# Altium integrated library mylib.IntLib: 236 symbols (part 1 of 2)
Pins are listed as number, name and electrical type; pins without a type are passive.

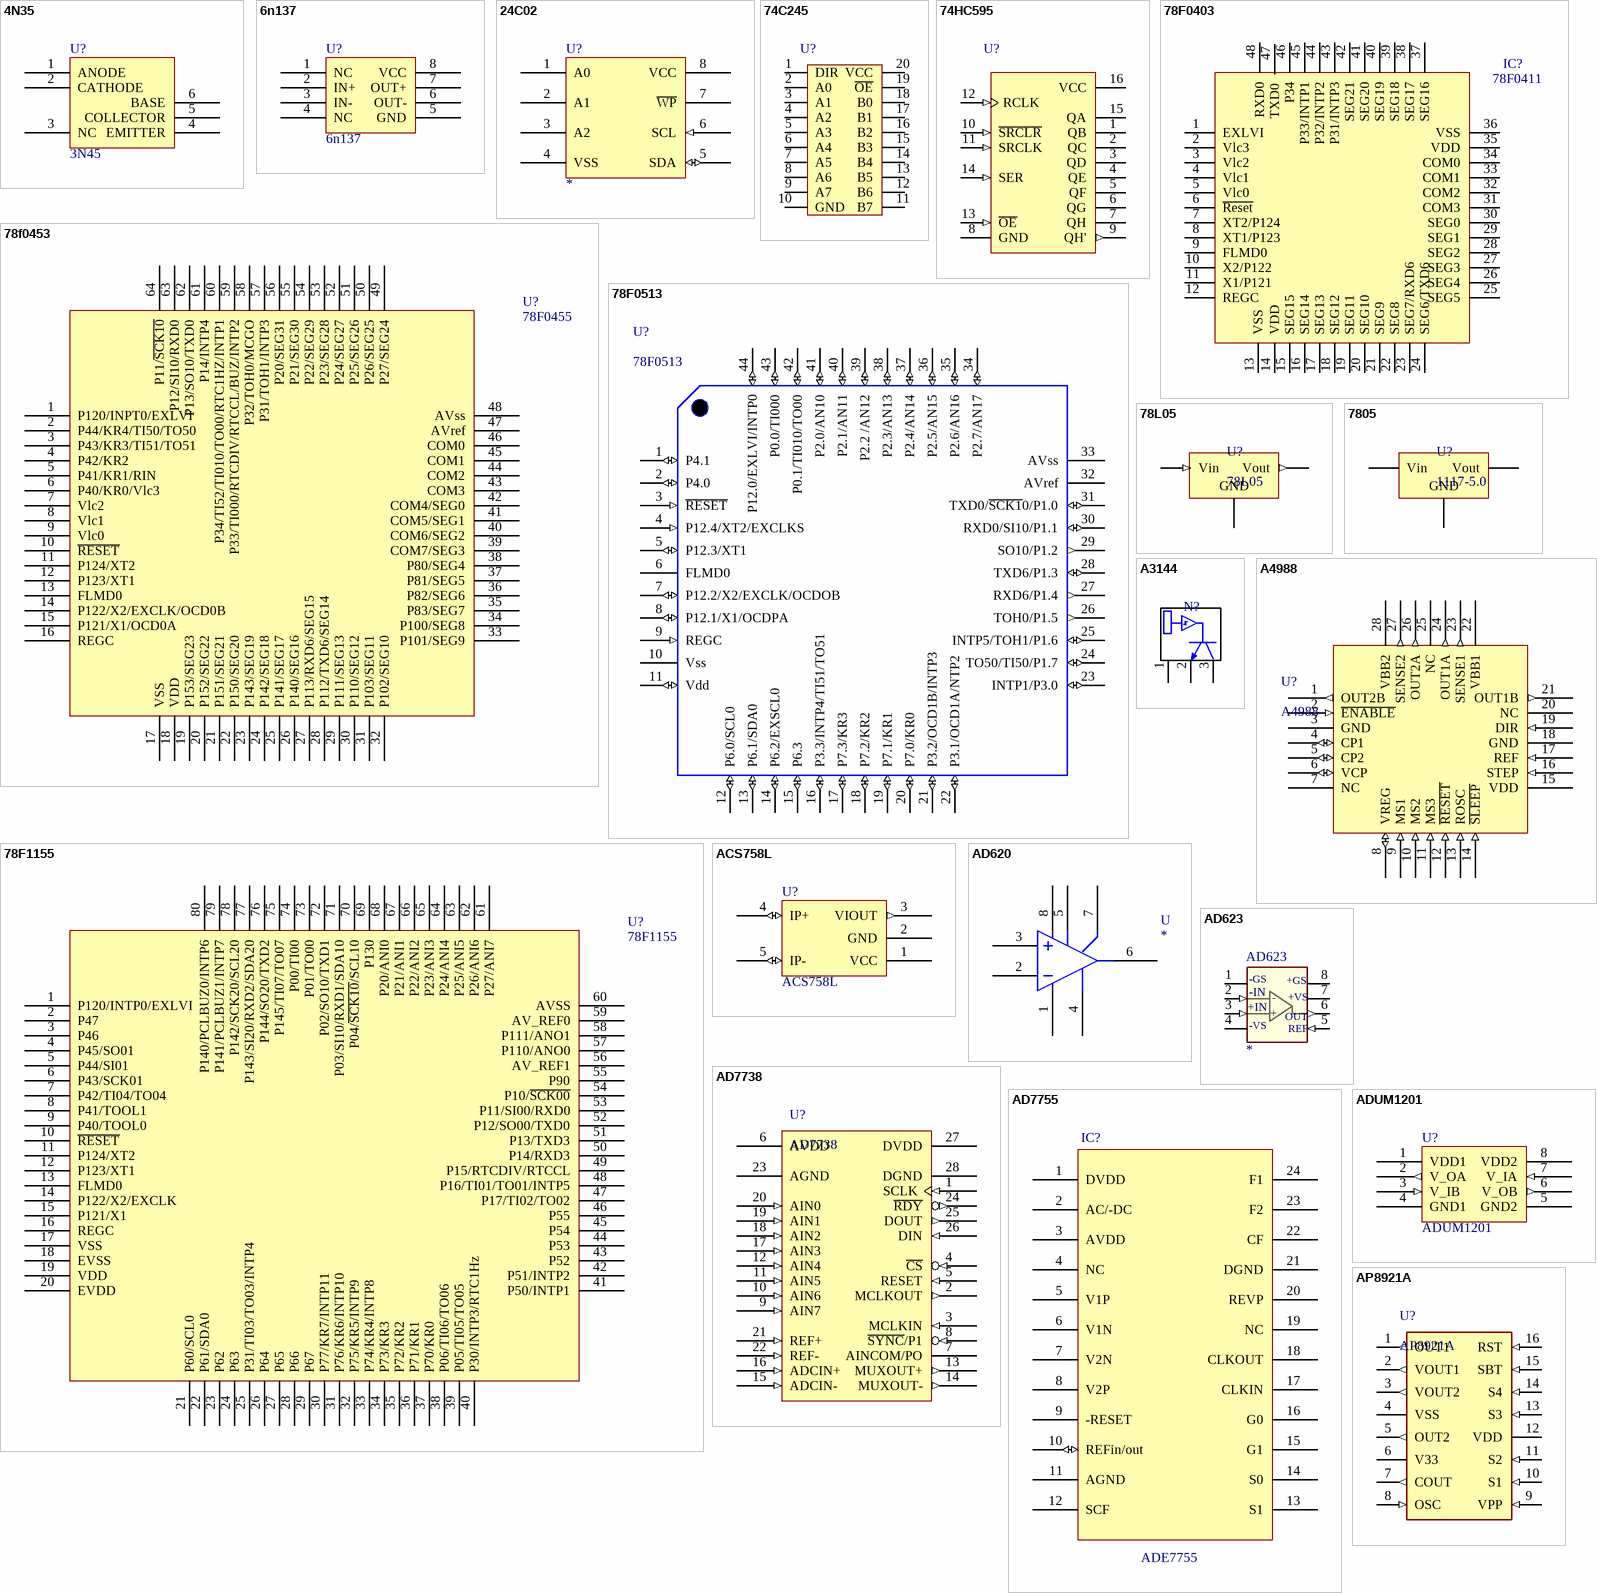
[diagram p0: symbols 4N35 to AP8921A]

## 4N35
designator U?, comment 3N45
footprint DIP6
pins: 1 ANODE, 2 CATHODE, 3 NC, 4 EMITTER, 5 COLLECTOR, 6 BASE

## 6n137
designator U?
footprint DIP8
pins: 1 NC, 2 IN+, 3 IN-, 4 NC, 5 GND (power), 6 OUT-, 7 OUT+, 8 VCC (power)

## 24C02
designator U?
pins: 1 A0, 2 A1, 3 A2, 4 VSS (power), 5 SDA (io), 6 SCL (in), 7 ~{WP}, 8 VCC (power)

## 74C245
designator U?  (value not drawn)
footprint DIP20
pins: 1 DIR, 2 A0, 3 A1, 4 A2, 5 A3, 6 A4, 7 A5, 8 A6, 9 A7, 10 GND (power), 11 B7 (power), 12 B6 (power), 13 B5 (power), 14 B4 (power), 15 B3 (power), 16 B2 (power), 17 B1 (power), 18 B0 (power), 19 ~{OE} (power), 20 VCC (power)

## 74HC595
designator U?  (value not drawn)
footprint SOJ-16
pins: 1 QB (hiz), 2 QC (hiz), 3 QD (hiz), 4 QE (hiz), 5 QF (hiz), 6 QG (hiz), 7 QH (hiz), 8 GND (power), 9 QH' (out), 10 ~{SRCLR} (in), 11 SRCLK (in), 12 RCLK (in), 13 ~{OE} (in), 14 SER (in), 15 QA (hiz), 16 VCC (power)

## 78F0403
designator IC?, comment 78F0411
footprint QUAD48
pins: 1 EXLVI, 2 Vlc3, 3 Vlc2, 4 Vlc1, 5 Vlc0, 6 ~{Reset}, 7 XT2/P124, 8 XT1/P123, 9 FLMD0, 10 X2/P122, 11 X1/P121, 12 REGC, 13 VSS, 14 VDD, 15 SEG15, 16 SEG14, 17 SEG13, 18 SEG12, 19 SEG11, 20 SEG10, 21 SEG9, 22 SEG8, 23 SEG7/RXD6, 24 SEG6/TXD6, 25 SEG5, 26 SEG4, 27 SEG3, 28 SEG2, 29 SEG1, 30 SEG0, 31 COM3, 32 COM2, 33 COM1, 34 COM0, 35 VDD, 36 VSS, 37 SEG16, 38 SEG17, 39 SEG18, 40 SEG19, 41 SEG20, 42 SEG21, 43 P31/INTP3, 44 P32/INTP2, 45 P33/INTP1, 46 P34, 47 TXD0, 48 RXD0
2 alternate drawings of the same symbol

## 78f0453
designator U?, comment 78F0455
footprint QFP12X12-64
pins: 1 P120/INPT0/EXLVI, 2 P44/KR4/TI50/TO50, 3 P43/KR3/TI51/TO51, 4 P42/KR2, 5 P41/KR1/RIN, 6 P40/KR0/Vlc3, 7 Vlc2, 8 Vlc1, 9 Vlc0, 10 ~{RESET}, 11 P124/XT2, 12 P123/XT1, 13 FLMD0, 14 P122/X2/EXCLK/OCD0B, 15 P121/X1/OCD0A, 16 REGC, 17 VSS, 18 VDD, 19 P153/SEG23, 20 P152/SEG22, 21 P151/SEG21, 22 P150/SEG20, 23 P143/SEG19, 24 P142/SEG18, 25 P141/SEG17, 26 P140/SEG16, 27 P113/RXD6/SEG15, 28 P112/TXD6/SEG14, 29 P111/SEG13, 30 P110/SEG12, 31 P103/SEG11, 32 P102/SEG10, 33 P101/SEG9, 34 P100/SEG8, 35 P83/SEG7, 36 P82/SEG6, 37 P81/SEG5, 38 P80/SEG4, 39 COM7/SEG3, 40 COM6/SEG2, 41 COM5/SEG1, 42 COM4/SEG0, 43 COM3, 44 COM2, 45 COM1, 46 COM0, 47 AVref, 48 AVss, 49 P27/SEG24, 50 P26/SEG25, 51 P25/SEG26, 52 P24/SEG27, 53 P23/SEG28, 54 P22/SEG29, 55 P21/SEG30, 56 P20/SEG31, 57 P31/TOH1/INTP3, 58 P32/TOH0/MCGO, 59 P33/TI000/RTCDIV/RTCCL/BUZ/INTP2, 60 P34/TI52/TI010/TO00/RTC1HZ/INTP1, 61 P14/INTP4, 62 P13/SO10/TXD0, 63 P12/SI10/RXD0, 64 P11/~{SCK10}
2 alternate drawings of the same symbol

## 78F0513
designator U?
footprint QFP10X10-G44/P.8N
pins: 1 P4.1 (io), 2 P4.0 (io), 3 ~{RESET} (in), 4 P12.4/XT2/EXCLKS (in), 5 P12.3/XT1 (io), 6 FLMD0, 7 P12.2/X2/EXCLK/OCDOB (io), 8 P12.1/X1/OCDPA (io), 9 REGC (in), 10 Vss (power), 11 Vdd (io), 12 P6.0/SCL0 (io), 13 P6.1/SDA0 (io), 14 P6.2/EXSCL0 (io), 15 P6.3 (io), 16 P3.3/INTP4/TI51/TO51 (io), 17 P7.3/KR3 (io), 18 P7.2/KR2 (io), 19 P7.1/KR1 (io), 20 P7.0/KR0 (io), 21 P3.2/OCD1B/INTP3 (io), 22 P3.1/OCD1A/NTP2 (io), 23 INTP1/P3.0 (io), 24 TO50/TI50/P1.7 (io), 25 INTP5/TOH1/P1.6 (io), 26 TOH0/P1.5 (out), 27 RXD6/P1.4 (out), 28 TXD6/P1.3 (io), 29 SO10/P1.2 (out), 30 RXD0/SI10/P1.1 (io), 31 TXD0/~{SCK1}0/P1.0 (io), 32 AVref (power), 33 AVss (power), 34 P2.7/AN17 (io), 35 P2.6/AN16 (io), 36 P2.5/AN15 (io), 37 P2.4/AN14 (io), 38 P2.3/AN13 (io), 39 P2.2 /AN12 (io), 40 P2.1/AN11 (io), 41 P2.0/AN10 (io), 42 P0.1/TI010/TO00 (io), 43 P0.0/TI000 (io), 44 P12.0/EXLVI/INTP0 (io)

## 78F1155
designator U?
footprint uPD78F1155
pins: 1 P120/INTP0/EXLVI, 2 P47, 3 P46, 4 P45/SO01, 5 P44/SI01, 6 P43/SCK01, 7 P42/TI04/TO04, 8 P41/TOOL1, 9 P40/TOOL0, 10 ~{RESET}, 11 P124/XT2, 12 P123/XT1, 13 FLMD0, 14 P122/X2/EXCLK, 15 P121/X1, 16 REGC, 17 VSS, 18 EVSS, 19 VDD, 20 EVDD, 21 P60/SCL0, 22 P61/SDA0, 23 P62, 24 P63, 25 P31/TI03/TO03/INTP4, 26 P64, 27 P65, 28 P66, 29 P67, 30 P77/KR7/INTP11, 31 P76/KR6/INTP10, 32 P75/KR5/INTP9, 33 P74/KR4/INTP8, 34 P73/KR3, 35 P72/KR2, 36 P71/KR1, 37 P70/KR0, 38 P06/TI06/TO06, 39 P05/TI05/TO05, 40 P30/INTP3/RTC1Hz, 41 P50/INTP1, 42 P51/INTP2, 43 P52, 44 P53, 45 P54, 46 P55, 47 P17/TI02/TO02, 48 P16/TI01/TO01/INTP5, 49 P15/RTCDIV/RTCCL, 50 P14/RXD3, 51 P13/TXD3, 52 P12/SO00/TXD0, 53 P11/SI00/RXD0, 54 P10/~{SCK00}, 55 P90, 56 AV_REF1, 57 P110/ANO0, 58 P111/ANO1, 59 AV_REF0, 60 AVSS, 61 P27/ANI7, 62 P26/ANI6, 63 P25/ANI5, 64 P24/ANI4, 65 P23/ANI3, 66 P22/ANI2, 67 P21/ANI1, 68 P20/ANI0, 69 P130, 70 P04/~{SCK10}/SCL10, 71 P03/SI10/RXD1/SDA10, 72 P02/SO10/TXD1, 73 P01/TO00, 74 P00/TI00, 75 P145/TI07/TO07, 76 P144/SO20/TXD2, 77 P143/SI20/RXD2/SDA20, 78 P142/SCK20/SCL20, 79 P141/PCLBUZ1/INTP7, 80 P140/PCLBUZ0/INTP6

## 78L05
designator U?
footprint TO-92
pins: 1 Vout (out), 2 GND (power), 3 Vin (in)

## 7805
designator U?, comment 1117-5.0
footprint SOT-223
pins: 1 GND, 2 Vout, 3 Vin

## A3144
designator N?, comment 霍尔元器件  (value not drawn)
pins: 1 (power), 2, 3

## A4988
designator U?
footprint QFN28 (QFN, 28-Leads, Body 5.00x5.00mm, Pitch 0.50mm, Thermal Pad 3.15x3.15mm, IPC Medium Density)
pins: 1 OUT2B (out), 2 ~{ENABLE} (in), 3 GND (power), 4 CP1 (io), 5 CP2 (io), 6 VCP (io), 7 NC, 8 VREG (io), 9 MS1 (in), 10 MS2 (in), 11 MS3 (in), 12 ~{RESET} (in), 13 ROSC (in), 14 ~{SLEEP} (in), 15 VDD (power), 16 STEP (in), 17 REF (in), 18 GND (power), 19 DIR (in), 20 NC, 21 OUT1B (out), 22 VBB1 (power), 23 SENSE1 (out), 24 OUT1A (out), 25 NC, 26 OUT2A (out), 27 SENSE2 (out), 28 VBB2 (power)

## ACS758L
designator U?
霍尔电流传感器
footprint PFF_ACS758
pins: 1 VCC (power), 2 GND (power), 3 VIOUT (out), 4 IP+ (io), 5 IP- (io)

## AD620
designator U
pins: 1, 2, 3, 4 VCC (power), 5, 6, 7 vcc (power), 8

## AD623
designator AD623
pins: 1 -RG, 2 -IN (in), 3 +IN (in), 4 -Vs (power), 5 Ref (in), 6 OUT (out), 7 +Vs (power), 8 +RG
text: -GS; +GS; -; +VS; +; -VS; REF

## AD7738
designator U?
pins: 1 SCLK (in), 2 MCLKOUT (out), 3 MCLKIN (in), 4 ~{CS} (in), 5 RESET (in), 6 AVDD (power), 7 AINCOM/PO, 8 ~{SYNC}/P1 (in), 9 AIN7 (in), 10 AIN6 (in), 11 AIN5 (in), 12 AIN4 (in), 13 MUXOUT+ (out), 14 MUXOUT- (out), 15 ADCIN- (in), 16 ADCIN+ (in), 17 AIN3 (in), 18 AIN2 (in), 19 AIN1 (in), 20 AIN0 (in), 21 REF+ (in), 22 REF- (in), 23 AGND (power), 24 ~{RDY} (out), 25 DOUT (out), 26 DIN (in), 27 DVDD (power), 28 DGND (power)

## AD7755
designator IC?, comment ADE7755
footprint SOP24 - DUPLICATE
footprint SSOP24-7755
pins: 1 DVDD, 2 AC/-DC, 3 AVDD, 4 NC, 5 V1P, 6 V1N, 7 V2N, 8 V2P, 9 -RESET, 10 REFin/out (io), 11 AGND, 12 SCF, 13 S1, 14 S0, 15 G1, 16 G0, 17 CLKIN, 18 CLKOUT, 19 NC, 20 REVP, 21 DGND, 22 CF, 23 F2, 24 F1
2 alternate drawings of the same symbol

## ADUM1201
designator U?
隔离器
footprint SO-8
pins: 1 VDD1 (power), 2 V_OA (out), 3 V_IB (in), 4 GND1 (power), 5 GND2 (power), 6 V_OB (out), 7 V_IA (in), 8 VDD2 (power)

## AP8921A
designator U?
footprint DIP16
pins: 1 OUT1 (out), 2 VOUT1 (out), 3 VOUT2 (out), 4 VSS (power), 5 OUT2 (out), 6 V33 (power), 7 COUT (out), 8 OSC (in), 9 VPP (in), 10 S1 (in), 11 S2 (in), 12 VDD (power), 13 S3 (in), 14 S4 (in), 15 SBT (in), 16 RST (in)

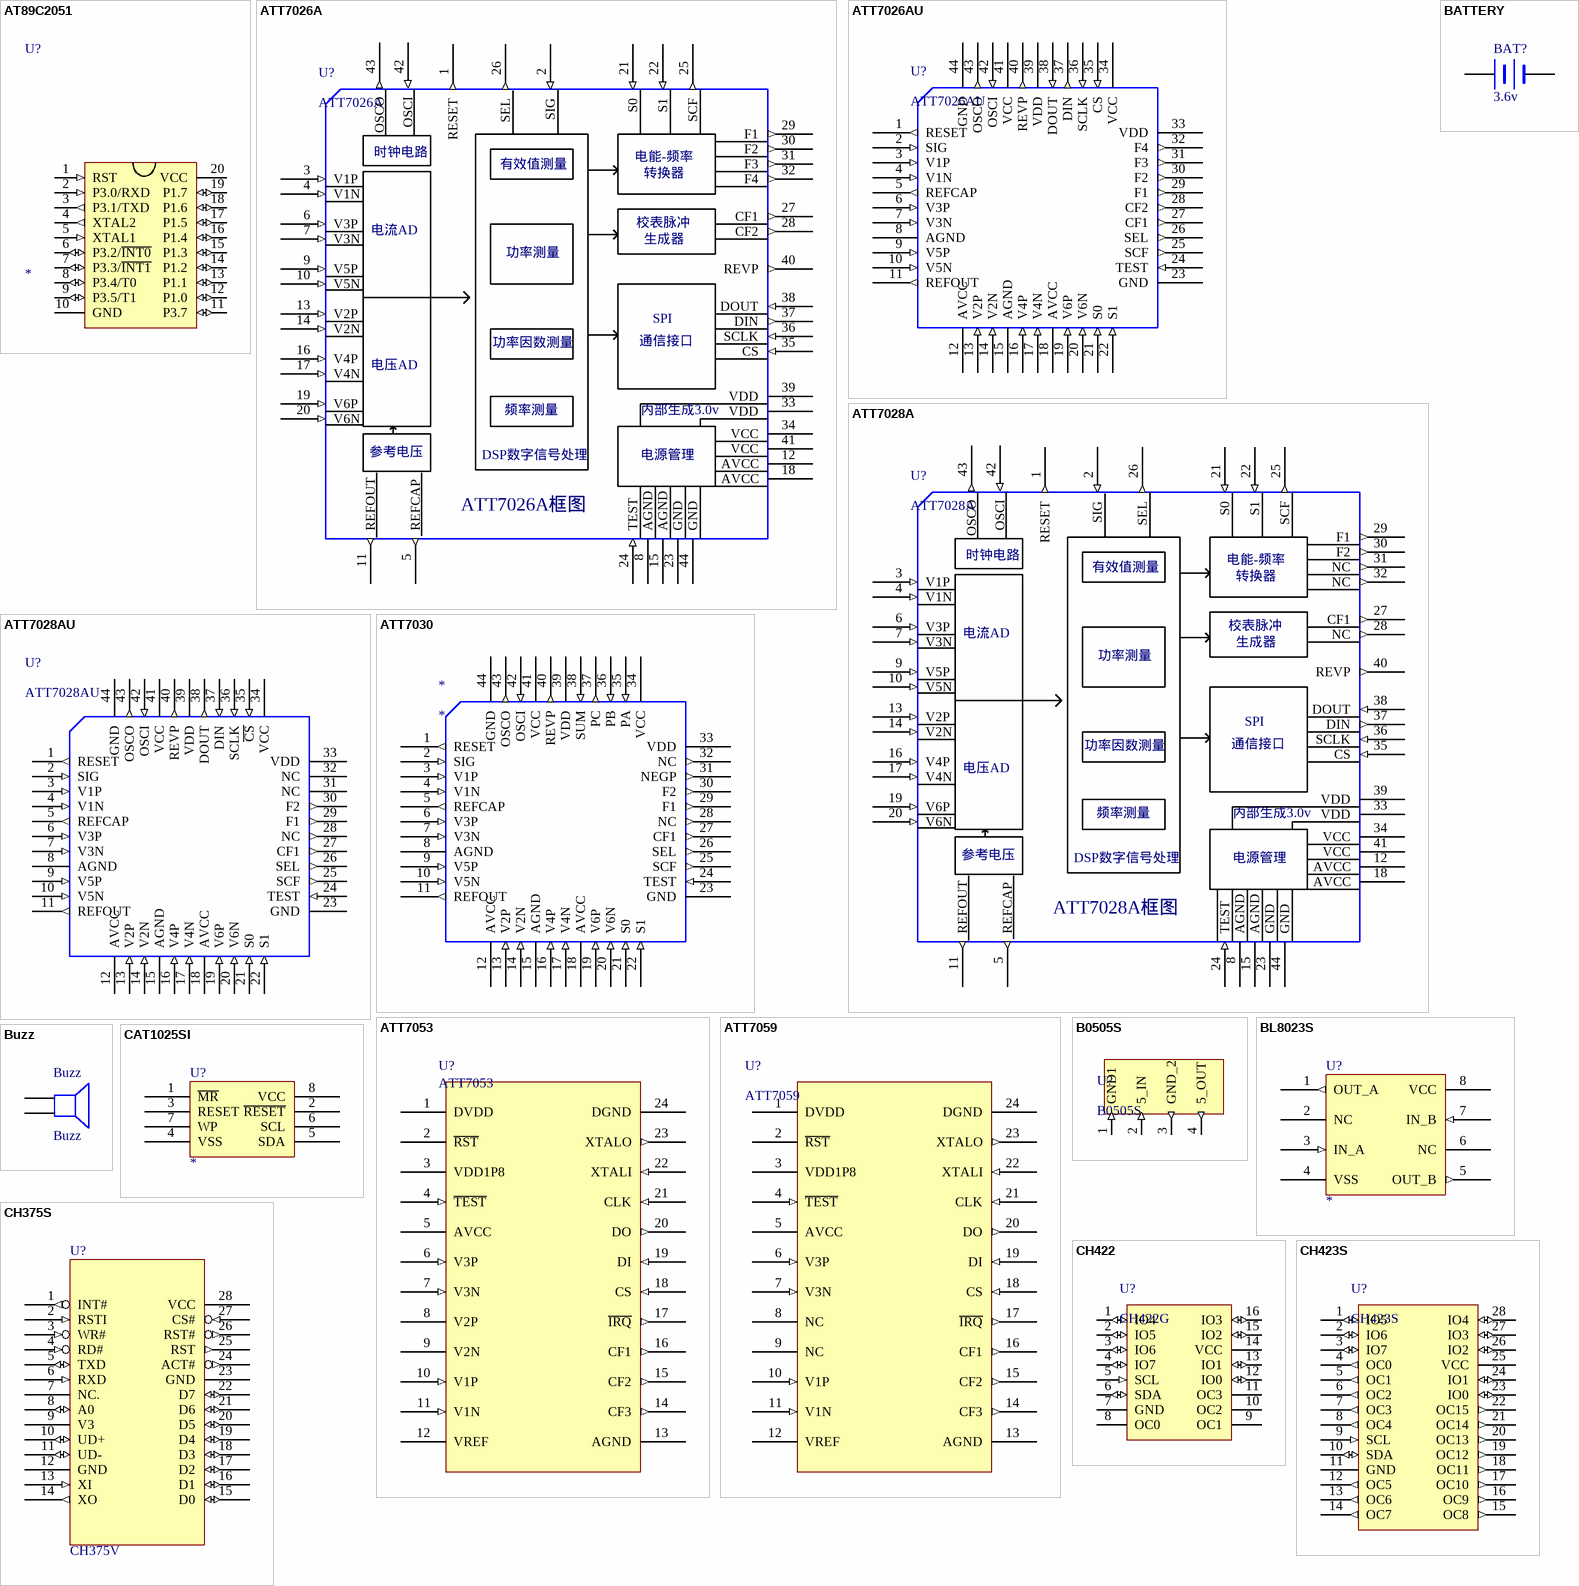
[diagram p1: symbols AT89C2051 to CH423S]

## AT89C2051
designator U?
footprint DIP20
pins: 1 RST (in), 2 P3.0/RXD (in), 3 P3.1/TXD (out), 4 XTAL2 (out), 5 XTAL1 (in), 6 P3.2/~{INT0} (io), 7 P3.3/~{INT1} (io), 8 P3.4/T0 (io), 9 P3.5/T1 (io), 10 GND (power), 11 P3.7 (io), 12 P1.0 (io), 13 P1.1 (io), 14 P1.2 (io), 15 P1.3 (io), 16 P1.4 (io), 17 P1.5 (io), 18 P1.6 (io), 19 P1.7 (io), 20 VCC (power)

## ATT7026A
designator U?
footprint ATT7026 (QFP, 44-Leads, Body 14.0x14.0mm (max), Pitch 0.80mm, IPC Medium Density)
pins: 1 RESET (out), 2 SIG (in), 3 V1P (in), 4 V1N (in), 5 REFCAP (out), 6 V3P (in), 7 V3N (in), 8 AGND (power), 9 V5P (in), 10 V5N (in), 11 REFOUT (out), 12 AVCC (power), 13 V2P (in), 14 V2N (in), 15 AGND (power), 16 V4P (in), 17 V4N (in), 18 AVCC (power), 19 V6P (in), 20 V6N (in), 21 S0 (in), 22 S1 (in), 23 GND (power), 24 TEST (in), 25 SCF (out), 26 SEL (out), 27 CF1 (out), 28 CF2 (out), 29 F1 (out), 30 F2 (out), 31 F3 (out), 32 F4 (out), 33 VDD (power), 34 VCC (power), 35 CS (in), 36 SCLK (in), 37 DIN (out), 38 DOUT (in), 39 VDD (power), 40 REVP (out), 41 VCC (power), 42 OSCI (in), 43 OSCO (out), 44 GND (power)
text: 时钟电路; 电能-频率; 有效值测量; 转换器; 校表脉冲; 电流AD; 生成器; 功率测量; SPI; 功率因数测量; 通信接口; 电压AD; 频率测量; 内部生成3.0v; 参考电压; DSP数字信号处理; 电源管理; ATT7026A框图

## ATT7026AU
designator U?
footprint ATT7026 (QFP, 44-Leads, Body 14.0x14.0mm (max), Pitch 0.80mm, IPC Medium Density)
pins: 1 RESET (out), 2 SIG (in), 3 V1P (in), 4 V1N (in), 5 REFCAP (out), 6 V3P (in), 7 V3N (in), 8 AGND (power), 9 V5P (in), 10 V5N (in), 11 REFOUT (out), 12 AVCC (power), 13 V2P (in), 14 V2N (in), 15 AGND (power), 16 V4P (in), 17 V4N (in), 18 AVCC (power), 19 V6P (in), 20 V6N (in), 21 S0 (in), 22 S1 (in), 23 GND (power), 24 TEST (in), 25 SCF (out), 26 SEL (out), 27 CF1 (out), 28 CF2 (out), 29 F1 (out), 30 F2 (out), 31 F3 (out), 32 F4 (out), 33 VDD (power), 34 VCC (power), 35 CS (in), 36 SCLK (in), 37 DIN (out), 38 DOUT (in), 39 VDD (power), 40 REVP (out), 41 VCC (power), 42 OSCI (in), 43 OSCO (out), 44 GND (power)

## ATT7028A
designator U?
footprint ATT7026 (QFP, 44-Leads, Body 14.0x14.0mm (max), Pitch 0.80mm, IPC Medium Density)
pins: 1 RESET (out), 2 SIG (in), 3 V1P (in), 4 V1N (in), 5 REFCAP (out), 6 V3P (in), 7 V3N (in), 8 AGND (power), 9 V5P (in), 10 V5N (in), 11 REFOUT (out), 12 AVCC (power), 13 V2P (in), 14 V2N (in), 15 AGND (power), 16 V4P (in), 17 V4N (in), 18 AVCC (power), 19 V6P (in), 20 V6N (in), 21 S0 (in), 22 S1 (in), 23 GND (power), 24 TEST (in), 25 SCF (out), 26 SEL (out), 27 CF1 (out), 28 NC (out), 29 F1 (out), 30 F2 (out), 31 NC (out), 32 NC (out), 33 VDD (power), 34 VCC (power), 35 CS (in), 36 SCLK (in), 37 DIN (out), 38 DOUT (in), 39 VDD (power), 40 REVP (out), 41 VCC (power), 42 OSCI (in), 43 OSCO (out), 44 GND (power)
text: 时钟电路; 电能-频率; 有效值测量; 转换器; 校表脉冲; 电流AD; 生成器; 功率测量; SPI; 功率因数测量; 通信接口; 电压AD; 频率测量; 内部生成3.0v; 参考电压; DSP数字信号处理; 电源管理; ATT7028A框图

## ATT7028AU
designator U?
footprint ATT7026 (QFP, 44-Leads, Body 14.0x14.0mm (max), Pitch 0.80mm, IPC Medium Density)
pins: 1 RESET (out), 2 SIG (in), 3 V1P (in), 4 V1N (in), 5 REFCAP (out), 6 V3P (in), 7 V3N (in), 8 AGND (power), 9 V5P (in), 10 V5N (in), 11 REFOUT (out), 12 AVCC (power), 13 V2P (in), 14 V2N (in), 15 AGND (power), 16 V4P (in), 17 V4N (in), 18 AVCC (power), 19 V6P (in), 20 V6N (in), 21 S0 (in), 22 S1 (in), 23 GND (power), 24 TEST (in), 25 SCF (out), 26 SEL (out), 27 CF1 (out), 28 NC (out), 29 F1 (out), 30 F2 (out), 31 NC, 32 NC, 33 VDD (power), 34 VCC (power), 35 ~{CS} (in), 36 SCLK (in), 37 DIN (in), 38 DOUT (out), 39 VDD (power), 40 REVP (out), 41 VCC (power), 42 OSCI (in), 43 OSCO (out), 44 GND (power)

## ATT7030
designator *
pins: 1 RESET (out), 2 SIG (in), 3 V1P (in), 4 V1N (in), 5 REFCAP (out), 6 V3P (in), 7 V3N (in), 8 AGND (power), 9 V5P (in), 10 V5N (in), 11 REFOUT (out), 12 AVCC (power), 13 V2P (in), 14 V2N (in), 15 AGND (power), 16 V4P (in), 17 V4N (in), 18 AVCC (power), 19 V6P (in), 20 V6N (in), 21 S0 (in), 22 S1 (in), 23 GND (power), 24 TEST (in), 25 SCF (out), 26 SEL (out), 27 CF1 (out), 28 NC (out), 29 F1 (out), 30 F2 (out), 31 NEGP (out), 32 NC (out), 33 VDD (power), 34 VCC (power), 35 PA (in), 36 PB (in), 37 PC (out), 38 SUM (in), 39 VDD (power), 40 REVP (out), 41 VCC (power), 42 OSCI (in), 43 OSCO (out), 44 GND (power)

## ATT7053
designator U?
footprint SSOP24 -7059
pins: 1 DVDD (power), 2 ~{RST}, 3 VDD1P8 (power), 4 ~{TEST} (in), 5 AVCC (power), 6 V3P (in), 7 V3N (in), 8 V2P, 9 V2N, 10 V1P (in), 11 V1N (in), 12 VREF (power), 13 AGND (power), 14 CF3 (out), 15 CF2 (out), 16 CF1 (out), 17 ~{IRQ} (out), 18 CS (in), 19 DI (in), 20 DO (out), 21 CLK (in), 22 XTALI (in), 23 XTALO (out), 24 DGND (power)

## ATT7059
designator U?
footprint SSOP24 -7059
pins: 1 DVDD (power), 2 ~{RST}, 3 VDD1P8 (power), 4 ~{TEST} (in), 5 AVCC (power), 6 V3P (in), 7 V3N (in), 8 NC, 9 NC, 10 V1P (in), 11 V1N (in), 12 VREF (power), 13 AGND (power), 14 CF3 (out), 15 CF2 (out), 16 CF1 (out), 17 ~{IRQ} (out), 18 CS (in), 19 DI (in), 20 DO (out), 21 CLK (in), 22 XTALI (in), 23 XTALO (out), 24 DGND (power)

## B0505S
designator U?
footprint B05S05
pins: 1 GND1 (in), 2 5_IN (in), 3 GND_2 (out), 4 5_OUT (out)

## BATTERY
designator BAT?, comment 3.6v
Battery
footprint BAT
pins: 1 +, 2 -
2 alternate drawings of the same symbol

## BL8023S
designator U?
footprint SO8 - duplicate (Small Outline; 8 Leads; Body Width 3.9 mm; Pitch 1.27 mm)
pins: 1 OUT_A (out), 2 NC, 3 IN_A (in), 4 VSS (power), 5 OUT_B (out), 6 NC, 7 IN_B (in), 8 VCC (power)

## Buzz
designator Buzz
Published: 24-Mar-1999; LatestRevisionDate: 17-Jul-2002; LatestRevisionNote: Re-released for DXP Platform.; PackageReference: PIN2; Publisher: Altium Limited
pins: 1, 2

## CAT1025SI
designator U?
footprint SO-8
pins: 1 ~{MR}, 2 ~{RESET}, 3 RESET, 4 VSS, 5 SDA, 6 SCL, 7 WP, 8 VCC

## CH375S
designator U?, comment CH375V
USB Host & Device / Slave for MCU, parallel / UART Serial
footprint SOP28
pins: 1 INT# (out), 2 RSTI (in), 3 WR# (in), 4 RD# (in), 5 TXD (io), 6 RXD (in), 7 NC., 8 A0 (io), 9 V3 (power), 10 UD+ (io), 11 UD- (io), 12 GND (power), 13 XI (in), 14 XO (out), 15 D0 (io), 16 D1 (io), 17 D2 (io), 18 D3 (io), 19 D4 (io), 20 D5 (io), 21 D6 (io), 22 D7 (io), 23 GND (power), 24 ACT# (out), 25 RST (out), 26 RST# (out), 27 CS# (in), 28 VCC (power)

## CH422
designator U?, comment CH422G
pins: 1 IO4 (io), 2 IO5 (io), 3 IO6 (io), 4 IO7 (io), 5 SCL (in), 6 SDA (io), 7 GND (power), 8 OC0 (oc), 9 OC1 (oc), 10 OC2 (oc), 11 OC3 (oc), 12 IO0 (io), 13 IO1 (io), 14 VCC (power), 15 IO2 (io), 16 IO3 (io)

## CH423S
designator U?
footprint SOP28
pins: 1 IO5 (io), 2 IO6 (io), 3 IO7 (io), 4 OC0 (out), 5 OC1 (out), 6 OC2 (out), 7 OC3 (out), 8 OC4 (out), 9 SCL (in), 10 SDA (io), 11 GND (power), 12 OC5 (out), 13 OC6 (out), 14 OC7 (out), 15 OC8 (out), 16 OC9 (out), 17 OC10 (out), 18 OC11 (out), 19 OC12 (out), 20 OC13 (out), 21 OC14 (out), 22 OC15 (out), 23 IO0 (io), 24 IO1 (io), 25 VCC (power), 26 IO2 (io), 27 IO3 (io), 28 IO4 (io)

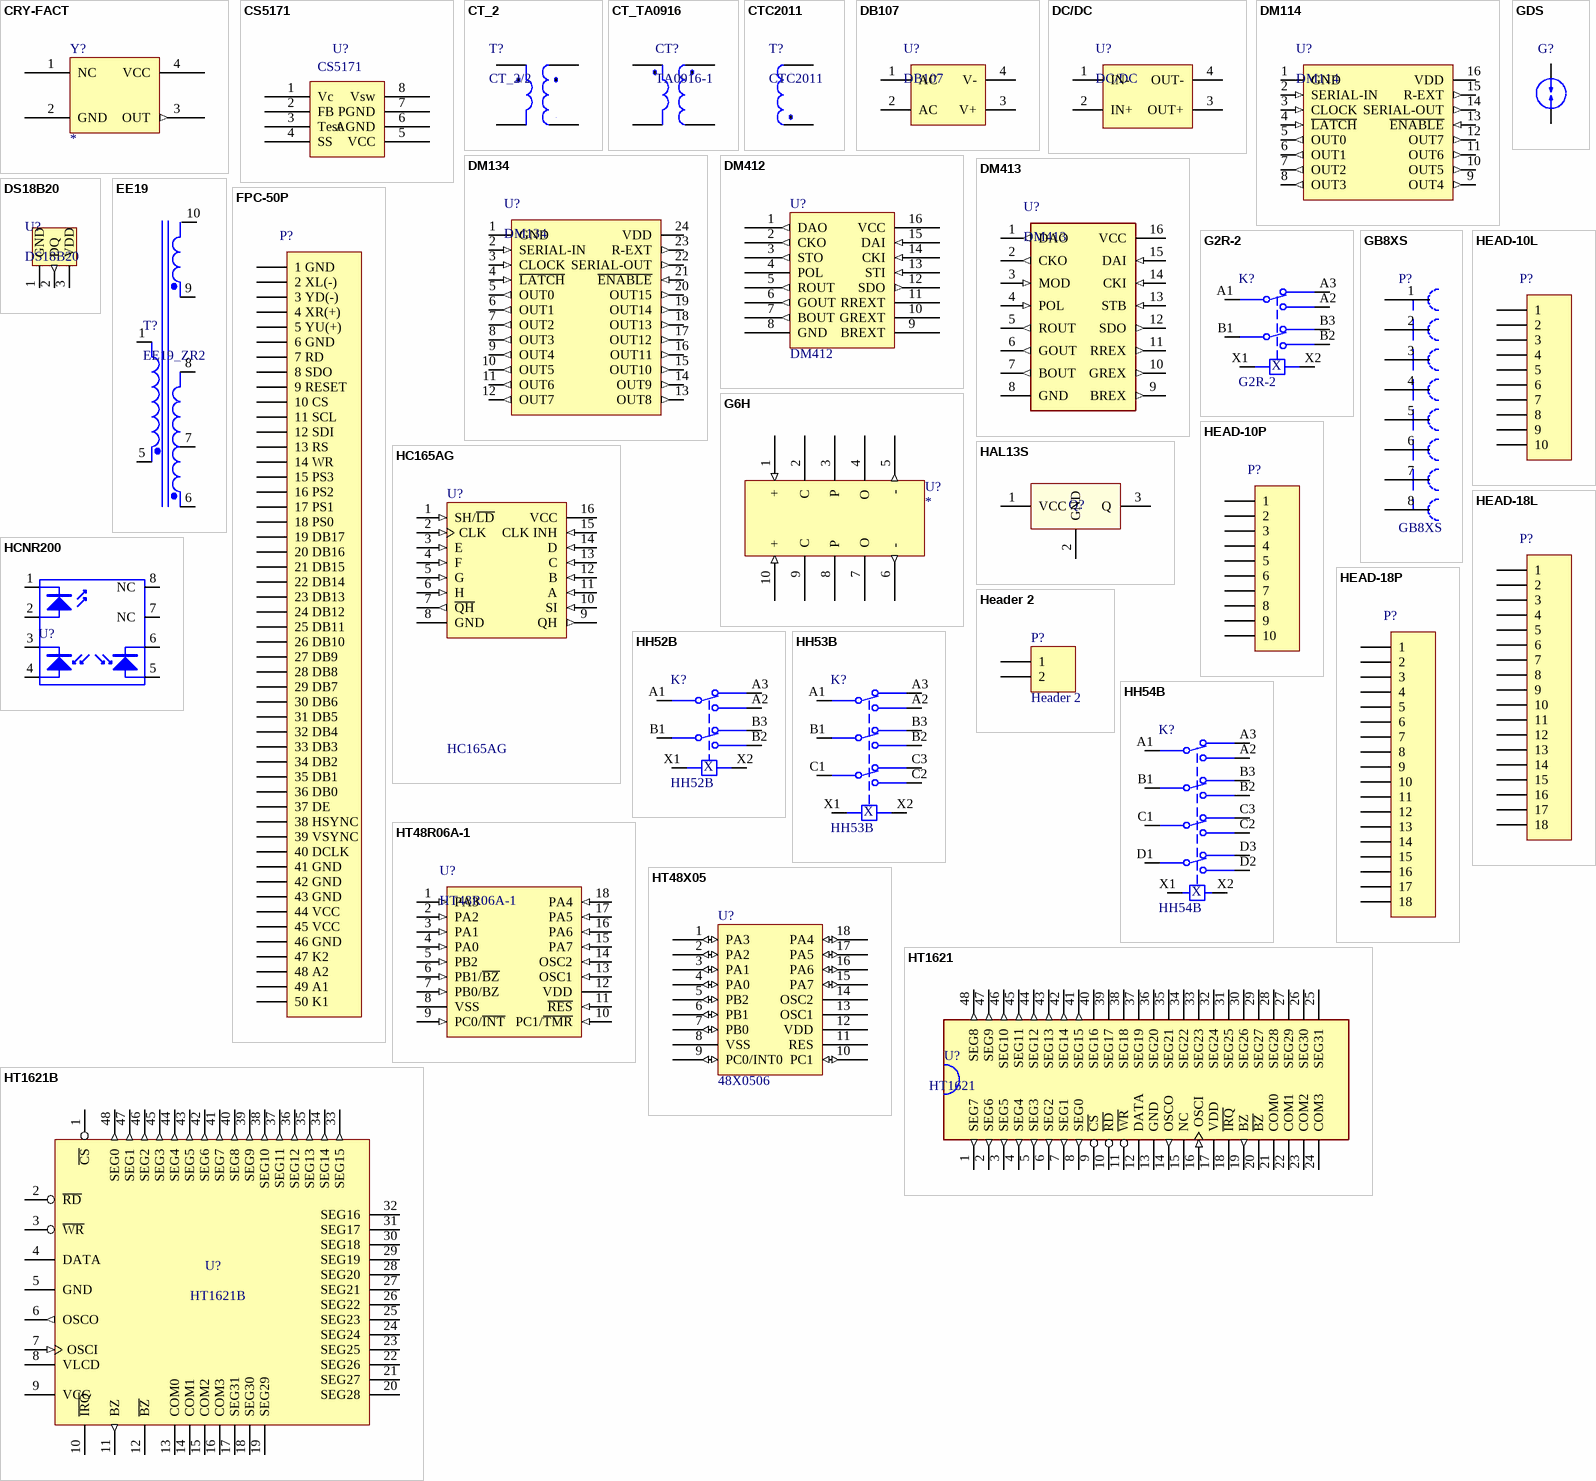
[diagram p2: symbols CRY-FACT to HT1621B]

## CRY-FACT
designator Y?
footprint YA-FACT
pins: 1 NC (hiz), 2 GND (power), 3 OUT (out), 4 VCC (power)

## CS5171
designator U?
footprint SO-8
pins: 1 Vc, 2 FB, 3 Test, 4 SS, 5 VCC, 6 AGND, 7 PGND, 8 Vsw
2 alternate drawings of the same symbol

## CT_2
designator T?, comment CT_2/2
footprint CT_2
pins: 1, 2, 3, 4

## CT_TA0916
designator CT?, comment TA0916-1
footprint CT2/4
pins: 1, 2, 3, 4

## CTC2011
designator T?
footprint CTC2011 (5A/2,5mA)
pins: 1, 2

## DB107
designator U?
footprint DB107
pins: 1 AC, 2 AC, 3 V+, 4 V-

## DC/DC
designator U?
footprint ND4805
pins: 1 IN-, 2 IN+, 3 OUT+, 4 OUT-

## DM114
designator U?
footprint DIP16
pins: 1 GND (power), 2 SERIAL-IN (in), 3 CLOCK (in), 4 ~{LATCH} (in), 5 OUT0 (out), 6 OUT1 (out), 7 OUT2 (out), 8 OUT3 (out), 9 OUT4 (out), 10 OUT5 (out), 11 OUT6 (out), 12 OUT7 (out), 13 ~{ENABLE} (in), 14 SERIAL-OUT (out), 15 R-EXT (out), 16 VDD (power)

## DM134
designator U?
footprint DIP24
pins: 1 GND (power), 2 SERIAL-IN (in), 3 CLOCK (in), 4 ~{LATCH} (in), 5 OUT0 (out), 6 OUT1 (out), 7 OUT2 (out), 8 OUT3 (out), 9 OUT4 (out), 10 OUT5 (out), 11 OUT6 (out), 12 OUT7 (out), 13 OUT8 (out), 14 OUT9 (out), 15 OUT10 (out), 16 OUT11 (out), 17 OUT12 (out), 18 OUT13 (out), 19 OUT14 (out), 20 OUT15 (out), 21 ~{ENABLE} (in), 22 SERIAL-OUT (out), 23 R-EXT (out), 24 VDD (power)

## DM412
designator U?
footprint SSOP16 (Footprint not found)
pins: 1 DAO (out), 2 CKO (out), 3 STO (out), 4 POL, 5 ROUT (out), 6 GOUT (out), 7 BOUT (out), 8 GND (power), 9 BREXT, 10 GREXT, 11 RREXT, 12 SDO (out), 13 STI (in), 14 CKI (in), 15 DAI (in), 16 VCC (power)

## DM413
designator U?
pins: 1 DAO (out), 2 CKO (out), 3 MOD (in), 4 POL (in), 5 ROUT (out), 6 GOUT (out), 7 BOUT (out), 8 GND (power), 9 BREX (out), 10 GREX (out), 11 RREX (out), 12 SDO (out), 13 STB (in), 14 CKI (in), 15 DAI (in), 16 VCC (power)

## DS18B20
designator U?
footprint TO-92_DS18B20
pins: 1 GND (power), 2 DQ (out), 3 VDD (power)

## EE19
designator T?, comment EE19_ZR2
footprint EE19
pins: 1, 5, 6, 7, 8, 9, 10

## FPC-50P
designator P?, comment SH230R-5.08  (value not drawn)
pins: 1 1 GND, 2 2 XL(-), 3 3 YD(-), 4 4 XR(+), 5 5 YU(+), 6 6 GND, 7 7 RD, 8 8 SDO, 9 9 RESET, 10 10 CS, 11 11 SCL, 12 12 SDI, 13 13 RS, 14 14 WR, 15 15 PS3, 16 16 PS2, 17 17 PS1, 18 18 PS0, 19 19 DB17, 20 20 DB16, 21 21 DB15, 22 22 DB14, 23 23 DB13, 24 24 DB12, 25 25 DB11, 26 26 DB10, 27 27 DB9, 28 28 DB8, 29 29 DB7, 30 30 DB6, 31 31 DB5, 32 32 DB4, 33 33 DB3, 34 34 DB2, 35 35 DB1, 36 36 DB0, 37 37 DE, 38 38 HSYNC, 39 39 VSYNC, 40 40 DCLK, 41 41 GND, 42 42 GND, 43 43 GND, 44 44 VCC, 45 45 VCC, 46 46 GND, 47 47 K2, 48 48 A2, 49 49 A1, 50 50 K1